# Altium footprint library WE-RJ45 LAN.PcbLib: 107 footprints (part 1 of 7) (continued)
## 7498011211 [mm] "LAN Transformer, body 21.65x15.88mm"
height 13.5
pads (14):
  rect 0.76x2.03 smd: 1(-5.715,11.615) 2(-4.445,11.615) 3(-3.175,11.615) 4(-1.905,11.615) 5(-0.635,11.615) 6(0.635,11.615) 7(1.905,11.615) 8(3.175,11.615) 9(4.445,11.615) 10(5.715,11.615)
  round 3.22 hole 3.22 unplated: MH1(-5.715,-0.065) MH2(5.715,-0.065)
  rect 3.3x3.3 smd: Shell(-9.145,-0.065) Shell(9.145,-0.065)
Top Overlay:
  lines w0.2: -9.209,-4.228 cw(c-10.32,-4.84) -9.053,-4.897 ccw(c-5.438,-5.337) -9.08,-5.367 ccw(c15.584,-6.195) -9.009,-8.239 ccw(c-0.59,-6.72) -8.04,-10.925 ; -8.04,-2.025 -8.04,-10.925 ; -8.04,1.875 -8.04,10.925 -6.39,10.925 ; 6.36,10.925 8.04,10.925 8.04,1.875 ; 8.04,-2.025 8.04,-10.925 ; 9.209,-4.228 ccw(c10.32,-4.84) 9.053,-4.897 cw(c5.438,-5.337) 9.08,-5.367 cw(c-15.584,-6.195) 9.009,-8.239 cw(c0.59,-6.72) 8.04,-10.925 ; -8.04,-10.925 8.04,-10.925
Top Designator:
  text ".Designator" at -7.498,-0.5 h1.5
Top Component Outline:
  lines w0.1: -9.209,-4.228 cw(c-10.32,-4.84) -9.053,-4.897 ccw(c-5.438,-5.337) -9.08,-5.367 ccw(c15.584,-6.195) -9.009,-8.239 ccw(c-0.59,-6.72) -8.04,-10.925 ; -8.04,-1.315 -10.25,-1.315 -10.25,1.185 -8.04,1.185 ; -5.945,10.925 -5.945,12.36 -5.485,12.36 -5.485,10.925 ; -4.675,10.925 -4.675,12.36 -4.215,12.36 -4.215,10.925 ; -3.405,10.925 -3.405,12.36 -2.945,12.36 -2.945,10.925 ; -2.135,10.925 -2.135,12.36 -1.675,12.36 -1.675,10.925 ; -0.865,10.925 -0.865,12.36 -0.405,12.36 -0.405,10.925 ; 0.405,10.925 0.405,12.36 0.865,12.36 0.865,10.925 ; 1.675,10.925 1.675,12.36 2.135,12.36 2.135,10.925 ; 2.945,10.925 2.945,12.36 3.405,12.36 3.405,10.925 ; 4.215,10.925 4.215,12.36 4.675,12.36 4.675,10.925 ; 5.485,10.925 5.485,12.36 5.945,12.36 5.945,10.925 ; 8.04,-1.315 10.25,-1.315 10.25,1.185 8.04,1.185 ; 9.209,-4.228 ccw(c10.32,-4.84) 9.053,-4.897 cw(c5.438,-5.337) 9.08,-5.367 cw(c-15.584,-6.195) 9.009,-8.239 cw(c0.59,-6.72) 8.04,-10.925 ; -8.04,-10.925 -8.04,10.925 8.04,10.925 8.04,-10.925 ; -8.04,-10.925 8.04,-10.925
Top 3D Body:
  lines w0.1: -9.209,-4.228 cw(c-10.32,-4.84) -9.053,-4.897 ccw(c-5.438,-5.337) -9.08,-5.367 ccw(c15.584,-6.195) -9.009,-8.239 ccw(c-0.59,-6.72) -8.04,-10.925 ; -8.04,-1.315 -10.25,-1.315 -10.25,1.185 -8.04,1.185 ; -5.945,10.925 -5.945,12.36 -5.485,12.36 -5.485,10.925 ; -4.675,10.925 -4.675,12.36 -4.215,12.36 -4.215,10.925 ; -3.405,10.925 -3.405,12.36 -2.945,12.36 -2.945,10.925 ; -2.135,10.925 -2.135,12.36 -1.675,12.36 -1.675,10.925 ; -0.865,10.925 -0.865,12.36 -0.405,12.36 -0.405,10.925 ; 0.405,10.925 0.405,12.36 0.865,12.36 0.865,10.925 ; 1.675,10.925 1.675,12.36 2.135,12.36 2.135,10.925 ; 2.945,10.925 2.945,12.36 3.405,12.36 3.405,10.925 ; 4.215,10.925 4.215,12.36 4.675,12.36 4.675,10.925 ; 5.485,10.925 5.485,12.36 5.945,12.36 5.945,10.925 ; 8.04,-1.315 10.25,-1.315 10.25,1.185 8.04,1.185 ; 9.209,-4.228 ccw(c10.32,-4.84) 9.053,-4.897 cw(c5.438,-5.337) 9.08,-5.367 cw(c-15.584,-6.195) 9.009,-8.239 cw(c0.59,-6.72) 8.04,-10.925 ; -8.04,-10.925 8.04,-10.925 ; -8.04,-10.925 -8.04,10.925 8.04,10.925 8.04,-10.925
Top Courtyard:
  lines w0.05: -0.5,0 0.5,0 ; 0,-0.5 0,0.5 ; -10.995,-11.125 10.995,-11.125 10.995,12.83 -10.995,12.83 -10.995,-11.125
3D body "7498011211.stp": height 14.82, standoff -2.7, extent -10.25,-10.79 10.25,12.36

## 7498111001A [mm] "LAN Transformer, body 21.6x15.88mm"
height 13.5
pads (14):
  rect 0.76x2.03 smd: 1(5.715,11.64) 2(4.445,11.64) 3(3.175,11.64) 4(1.905,11.64) 5(0.635,11.64) 6(-0.635,11.64) 7(-1.905,11.64) 8(-3.175,11.64) 9(-4.445,11.64) 10(-5.715,11.64)
  round 3.22 hole 3.22 unplated: MH1(-5.715,-0.04) MH2(5.715,-0.04)
  rect 3.3x3.18 smd: Shell(-9.145,-0.04) Shell(9.145,-0.04)
Top Overlay:
  lines w0.2: -9.209,-4.203 cw(c-10.32,-4.815) -9.053,-4.872 ccw(c-5.438,-5.312) -9.08,-5.342 ccw(c15.584,-6.17) -9.009,-8.214 ccw(c-0.59,-6.695) -8.04,-10.9 ; -8.04,-1.92 -8.04,-10.9 ; -8.04,1.84 -8.04,10.9 -6.39,10.9 ; 6.41,10.9 8.04,10.9 8.04,1.84 ; 8.04,-1.92 8.04,-10.9 ; 9.209,-4.203 ccw(c10.32,-4.815) 9.053,-4.872 cw(c5.438,-5.312) 9.08,-5.342 cw(c-15.584,-6.17) 9.009,-8.214 cw(c0.59,-6.695) 8.04,-10.9 ; -8.04,-10.9 8.04,-10.9
Top Designator:
  text ".Designator" at -7.498,-0.5 h1.5
Top Component Outline:
  lines w0.1: -9.209,-4.203 cw(c-10.32,-4.815) -9.053,-4.872 ccw(c-5.438,-5.312) -9.08,-5.342 ccw(c15.584,-6.17) -9.009,-8.214 ccw(c-0.59,-6.695) -8.04,-10.9 ; -8.04,-1.24 -10.25,-1.24 -10.25,1.16 -8.04,1.16 ; -5.935,10.9 -5.935,11.86 -5.495,11.86 -5.495,10.9 ; -4.665,10.9 -4.665,11.86 -4.225,11.86 -4.225,10.9 ; -3.395,10.9 -3.395,11.86 -2.955,11.86 -2.955,10.9 ; -2.125,10.9 -2.125,11.86 -1.685,11.86 -1.685,10.9 ; -0.855,10.9 -0.855,11.86 -0.415,11.86 -0.415,10.9 ; 0.415,10.9 0.415,11.86 0.855,11.86 0.855,10.9 ; 1.685,10.9 1.685,11.86 2.125,11.86 2.125,10.9 ; 2.955,10.9 2.955,11.86 3.395,11.86 3.395,10.9 ; 4.225,10.9 4.225,11.86 4.665,11.86 4.665,10.9 ; 5.495,10.9 5.495,11.86 5.935,11.86 5.935,10.9 ; 8.04,-1.24 10.25,-1.24 10.25,1.16 8.04,1.16 ; 9.209,-4.203 ccw(c10.32,-4.815) 9.053,-4.872 cw(c5.438,-5.312) 9.08,-5.342 cw(c-15.584,-6.17) 9.009,-8.214 cw(c0.59,-6.695) 8.04,-10.9 ; -8.04,-10.9 8.04,-10.9 ; -8.04,-10.9 -8.04,10.9 8.04,10.9 8.04,-10.9
Top 3D Body:
  lines w0.1: -9.209,-4.203 cw(c-10.32,-4.815) -9.053,-4.872 ccw(c-5.438,-5.312) -9.08,-5.342 ccw(c15.584,-6.17) -9.009,-8.214 ccw(c-0.59,-6.695) -8.04,-10.9 ; -8.04,-1.24 -10.25,-1.24 -10.25,1.16 -8.04,1.16 ; -5.935,10.9 -5.935,11.86 -5.495,11.86 -5.495,10.9 ; -4.665,10.9 -4.665,11.86 -4.225,11.86 -4.225,10.9 ; -3.395,10.9 -3.395,11.86 -2.955,11.86 -2.955,10.9 ; -2.125,10.9 -2.125,11.86 -1.685,11.86 -1.685,10.9 ; -0.855,10.9 -0.855,11.86 -0.415,11.86 -0.415,10.9 ; 0.415,10.9 0.415,11.86 0.855,11.86 0.855,10.9 ; 1.685,10.9 1.685,11.86 2.125,11.86 2.125,10.9 ; 2.955,10.9 2.955,11.86 3.395,11.86 3.395,10.9 ; 4.225,10.9 4.225,11.86 4.665,11.86 4.665,10.9 ; 5.495,10.9 5.495,11.86 5.935,11.86 5.935,10.9 ; 8.04,-1.24 10.25,-1.24 10.25,1.16 8.04,1.16 ; 9.209,-4.203 ccw(c10.32,-4.815) 9.053,-4.872 cw(c5.438,-5.312) 9.08,-5.342 cw(c-15.584,-6.17) 9.009,-8.214 cw(c0.59,-6.695) 8.04,-10.9 ; -8.04,-10.9 -8.04,10.9 8.04,10.9 8.04,-10.9 ; -8.04,-10.9 8.04,-10.9
Top Courtyard:
  lines w0.05: -0.5,0 0.5,0 ; 0,-0.5 0,0.5 ; -10.995,-11.1 -10.995,12.855 10.995,12.855 10.995,-11.1 -10.995,-11.1
3D body "7498111001.stp": height 13.6, standoff -2.62, extent -10.25,-10.74 10.25,11.86

## 7498111120AR [mm] "LAN Transformer, body 21.84x15.65mm"
height 8.89
pads (18):
  rect 0.71x2.29 smd: 1(6.63,10.14) 2(5.61,10.14) 3(4.59,10.14) 4(3.57,10.14) 5(2.55,10.14) 6(1.53,10.14) 7(0.51,10.14) 8(-0.51,10.14) 9(-1.53,10.14) 10(-2.55,10.14) 11(-3.57,10.14) 12(-4.59,10.14) 13(-5.61,10.14) 14(-6.63,10.14)
  round 1.4 hole 1.4 unplated: MH1(-3.5,6.96) MH2(3.5,6.96)
  rect 1.4x2.54 smd: Shell(-8.51,-3.24) Shell(8.51,-3.24)
Top Overlay:
  lines w0.2: -8.93,-4.858 ccw(c-7.19,-4.955) -8.926,-5.104 ccw(c-7.186,-5.201) -8.922,-5.351 ccw(c-7.183,-5.447) -8.919,-5.597 ccw(c-7.179,-5.694) -8.915,-5.843 ccw(c-7.175,-5.94) -8.911,-6.09 ccw(c-1.375,-5.89) -8.847,-6.888 ccw(c-3.725,-6.44) -7.933,-9.395 ; -7.925,-4.84 -7.925,-11.34 7.925,-11.34 7.925,-4.84 ; -7.925,-1.64 -7.925,10.7 -7.315,10.7 ; 7.315,10.7 7.925,10.7 7.925,-1.64 ; 7.933,-9.395 ccw(c3.725,-6.44) 8.847,-6.888 ccw(c1.375,-5.89) 8.911,-6.09 ccw(c7.175,-5.94) 8.915,-5.843 ccw(c7.179,-5.694) 8.919,-5.597 ccw(c7.183,-5.447) 8.922,-5.351 ccw(c7.186,-5.201) 8.926,-5.104 ccw(c7.19,-4.955) 8.93,-4.858
Keep-Out Layer:
  board cut-out: -7.81,-11.24 -7.81,2.73 7.81,2.73 7.81,-11.24
Top Designator:
  text ".Designator" at -7.498,-0.5 h1.5
Mechanical 8:
  lines w0.1: -7.81,-11.24 7.81,-11.24 7.81,2.73 -7.81,2.73 -7.81,-11.24
  text "PCB Cutout Area" at -7.2,-4.13 h1.02
Top Component Outline:
  lines w0.1: -8.93,-4.858 ccw(c-7.19,-4.955) -8.926,-5.104 ccw(c-7.186,-5.201) -8.922,-5.351 ccw(c-7.183,-5.447) -8.919,-5.597 ccw(c-7.179,-5.694) -8.915,-5.843 ccw(c-7.175,-5.94) -8.911,-6.09 ccw(c-1.375,-5.89) -8.847,-6.888 ccw(c-3.725,-6.44) -7.933,-9.395 ; -6.83,10.7 -6.83,11.24 -6.43,11.24 -6.43,10.7 ; -5.81,10.7 -5.81,11.24 -5.41,11.24 -5.41,10.7 ; -4.79,10.7 -4.79,11.24 -4.39,11.24 -4.39,10.7 ; -3.77,10.7 -3.77,11.24 -3.37,11.24 -3.37,10.7 ; -2.75,10.7 -2.75,11.24 -2.35,11.24 -2.35,10.7 ; -1.73,10.7 -1.73,11.24 -1.33,11.24 -1.33,10.7 ; -0.71,10.7 -0.71,11.24 -0.31,11.24 -0.31,10.7 ; 0.31,10.7 0.31,11.24 0.71,11.24 0.71,10.7 ; 1.33,10.7 1.33,11.24 1.73,11.24 1.73,10.7 ; 2.35,10.7 2.35,11.24 2.75,11.24 2.75,10.7 ; 3.37,10.7 3.37,11.24 3.77,11.24 3.77,10.7 ; 4.39,10.7 4.39,11.24 4.79,11.24 4.79,10.7 ; 5.41,10.7 5.41,11.24 5.81,11.24 5.81,10.7 ; 6.43,10.7 6.43,11.24 6.83,11.24 6.83,10.7 ; 7.933,-9.395 ccw(c3.725,-6.44) 8.847,-6.888 ccw(c1.375,-5.89) 8.911,-6.09 ccw(c7.175,-5.94) 8.915,-5.843 ccw(c7.179,-5.694) 8.919,-5.597 ccw(c7.183,-5.447) 8.922,-5.351 ccw(c7.186,-5.201) 8.926,-5.104 ccw(c7.19,-4.955) 8.93,-4.858 ; -9.075,-4.29 -7.925,-4.29 -9.075,-4.29 ; -9.075,-4.29 -9.075,-2.19 ; -9.075,-4.29 -9.075,-2.19 ; -9.075,-2.19 -7.925,-2.19 -9.075,-2.19 ; 9.075,-4.29 9.075,-2.19 ; 9.075,-4.29 7.925,-4.29 9.075,-4.29 ; 9.075,-4.29 9.075,-2.19 ; 9.075,-2.19 7.925,-2.19 9.075,-2.19 ; -7.925,-11.34 -7.925,10.7 7.925,10.7 7.925,-11.34 -7.925,-11.34
Top 3D Body:
  lines w0.1: -8.93,-4.858 ccw(c-7.19,-4.955) -8.926,-5.104 ccw(c-7.186,-5.201) -8.922,-5.351 ccw(c-7.183,-5.447) -8.919,-5.597 ccw(c-7.179,-5.694) -8.915,-5.843 ccw(c-7.175,-5.94) -8.911,-6.09 ccw(c-1.375,-5.89) -8.847,-6.888 ccw(c-3.725,-6.44) -7.933,-9.395 ; -6.83,10.7 -6.83,11.24 -6.43,11.24 -6.43,10.7 ; -5.81,10.7 -5.81,11.24 -5.41,11.24 -5.41,10.7 ; -4.79,10.7 -4.79,11.24 -4.39,11.24 -4.39,10.7 ; -3.77,10.7 -3.77,11.24 -3.37,11.24 -3.37,10.7 ; -2.75,10.7 -2.75,11.24 -2.35,11.24 -2.35,10.7 ; -1.73,10.7 -1.73,11.24 -1.33,11.24 -1.33,10.7 ; -0.71,10.7 -0.71,11.24 -0.31,11.24 -0.31,10.7 ; 0.31,10.7 0.31,11.24 0.71,11.24 0.71,10.7 ; 1.33,10.7 1.33,11.24 1.73,11.24 1.73,10.7 ; 2.35,10.7 2.35,11.24 2.75,11.24 2.75,10.7 ; 3.37,10.7 3.37,11.24 3.77,11.24 3.77,10.7 ; 4.39,10.7 4.39,11.24 4.79,11.24 4.79,10.7 ; 5.41,10.7 5.41,11.24 5.81,11.24 5.81,10.7 ; 6.43,10.7 6.43,11.24 6.83,11.24 6.83,10.7 ; 7.933,-9.395 ccw(c3.725,-6.44) 8.847,-6.888 ccw(c1.375,-5.89) 8.911,-6.09 ccw(c7.175,-5.94) 8.915,-5.843 ccw(c7.179,-5.694) 8.919,-5.597 ccw(c7.183,-5.447) 8.922,-5.351 ccw(c7.186,-5.201) 8.926,-5.104 ccw(c7.19,-4.955) 8.93,-4.858 ; -9.075,-4.29 -9.075,-2.19 ; -9.075,-4.29 -7.925,-4.29 -9.075,-4.29 ; -9.075,-4.29 -9.075,-2.19 ; -9.075,-2.19 -7.925,-2.19 -9.075,-2.19 ; 9.075,-4.29 7.925,-4.29 9.075,-4.29 ; 9.075,-4.29 9.075,-2.19 ; 9.075,-4.29 9.075,-2.19 ; 9.075,-2.19 7.925,-2.19 9.075,-2.19 ; -7.925,-11.34 7.925,-11.34 7.925,10.7 -7.925,10.7 -7.925,-11.34
Top Courtyard:
  lines w0.05: -9.41,-11.54 9.41,-11.54 ; -9.41,-11.485 -9.41,11.485 9.41,11.485 9.41,-11.485 ; -0.5,0 0.5,0 ; 0,-0.5 0,0.5
3D body "7498111120AR.stp": height 10.1, standoff -3.2, extent -9.075,-11.24 9.075,11.24

## 7498111123 [mm] "Integrated RJ45 Transformer, THR, body 15.9x21.25mm"
height 13.5
pads (18):
  round 1.4 hole 0.9: 1(-5.715,8.89) 2(-4.445,6.35) 3(-3.175,8.89) 4(-1.905,6.35) 5(-0.635,8.89) 6(0.635,6.35) 7(1.905,8.89) 8(3.175,6.35) 9(4.445,8.89) 10(5.715,6.35)
  round 1.8 hole 1.2: 11(-6.64,-4.06) 12(-4.1,-4.06) 13(4.1,-4.06) 14(6.64,-4.06)
  round 3.25 hole 3.25 unplated: MH1(-5.715,0) MH2(5.715,0)
  round 2.4 hole 1.6: Shell(-7.85,3.05) Shell(7.85,3.05)
Top Overlay:
  lines w0.2: -8.171,-2.975 ccw(c-5.3,-6.375) -7.95,-9.95 ; -7.95,1.54 -7.95,-10.75 7.95,-10.75 7.95,1.54 ; -7.95,4.84 -7.95,10.5 -6.955,10.5 ; 5.695,10.5 7.95,10.5 7.95,4.84 ; 7.95,-9.95 ccw(c5.3,-6.375) 8.171,-2.975
Top Paste:
  rectangle: 4.895,1.8 10.595,4.6
  region: -4.895,4.6 -10.595,4.6 -10.595,1.8 -4.895,1.8
  rectangle: -6.715,7.89 -4.715,10.49
  rectangle: -4.175,7.89 -2.175,10.49
  rectangle: -1.635,7.89 0.365,10.49
  rectangle: 0.905,7.89 2.905,10.49
  rectangle: 3.445,7.89 5.445,10.49
  rectangle: -5.445,4.95 -3.445,7.55
  rectangle: -2.905,4.95 -0.905,7.55
  rectangle: -0.365,4.95 1.635,7.55
  rectangle: 2.175,4.95 4.175,7.55
  rectangle: 4.715,4.95 6.715,7.55
  rectangle: 3.095,-5.66 5.095,-2.46
  rectangle: 5.635,-5.66 7.635,-2.46
  region: -5.625,-2.46 -7.625,-2.46 -7.625,-5.66 -5.625,-5.66
  region: -3.085,-2.46 -5.085,-2.46 -5.085,-5.66 -3.085,-5.66
Top Designator:
  text ".Designator" at -7.498,-0.5 h1.5
Top Component Outline:
  lines w0.1: -8.171,-2.975 ccw(c-5.3,-6.375) -7.95,-9.95 ; 7.95,-9.95 ccw(c5.3,-6.375) 8.171,-2.975 ; -7.95,-10.75 7.95,-10.75 7.95,10.5 -7.95,10.5 -7.95,-10.75
Top Courtyard:
  lines w0.05: -0.5,0 0.5,0 ; 0,-0.5 0,0.5 ; -10.795,-10.95 -10.795,10.7 10.795,10.7 10.795,-10.95 -10.795,-10.95
3D body "7498111123.stp": height 16.29, standoff -2.33, extent -9.718,-10.75 9.718,10.6

## 7498111124 [mm] "Integrated RJ45 Transformer, THR, body 15.9x21.25mm"
height 13.5
pads (18):
  round 1.4 hole 0.9: 1(-5.715,8.89) 2(-4.445,6.35) 3(-3.175,8.89) 4(-1.905,6.35) 5(-0.635,8.89) 6(0.635,6.35) 7(1.905,8.89) 8(3.175,6.35) 9(4.445,8.89) 10(5.715,6.35)
  round 1.52 hole 1.02: 11(-6.64,-4.06) 12(-4.09,-4.06) 13(4.09,-4.06) 14(6.64,-4.06)
  round 3.25 hole 3.25 unplated: MH1(-5.715,0) MH2(5.715,0)
  round 2.4 hole 1.6: Shell(-7.85,3.05) Shell(7.85,3.05)
Top Overlay:
  lines w0.2: -8.171,-2.975 ccw(c-5.3,-6.375) -7.95,-9.95 ; -7.95,1.5 -7.95,-10.75 7.95,-10.75 7.95,1.5 ; -7.95,4.85 -7.95,10.5 -6.95,10.5 ; 5.7,10.5 7.95,10.5 7.95,4.85 ; 7.95,-9.95 ccw(c5.3,-6.375) 8.171,-2.975
Top Paste:
  rectangle: 3.085,-5.66 5.085,-2.46
  rectangle: 5.625,-5.66 7.625,-2.46
  rectangle: -5.085,-5.66 -3.085,-2.46
  rectangle: -7.625,-5.66 -5.625,-2.46
  rectangle: 4.895,1.8 10.595,4.6
  region: -4.895,4.6 -10.595,4.6 -10.595,1.8 -4.895,1.8
  rectangle: -6.715,7.89 -4.715,10.49
  rectangle: -4.175,7.89 -2.175,10.49
  rectangle: -1.635,7.89 0.365,10.49
  rectangle: 0.905,7.89 2.905,10.49
  rectangle: 3.445,7.89 5.445,10.49
  rectangle: -5.445,4.95 -3.445,7.55
  rectangle: -2.905,4.95 -0.905,7.55
  rectangle: -0.365,4.95 1.635,7.55
  rectangle: 2.175,4.95 4.175,7.55
  rectangle: 4.715,4.95 6.715,7.55
Top Designator:
  text ".Designator" at -7.498,-0.5 h1.5
Top Component Outline:
  lines w0.1: -8.171,-2.975 ccw(c-5.3,-6.375) -7.95,-9.95 ; 7.95,-9.95 ccw(c5.3,-6.375) 8.171,-2.975 ; -7.95,-10.75 7.95,-10.75 7.95,10.5 -7.95,10.5 -7.95,-10.75
Top Courtyard:
  lines w0.05: -0.5,0 0.5,0 ; 0,-0.5 0,0.5 ; -10.795,-10.95 10.795,-10.95 10.795,10.7 -10.795,10.7 -10.795,-10.95
3D body "7498111124.stp": height 16.34, standoff -2.28, extent -9.718,-10.75 9.718,10.6

## 7498210002 [mm] "LAN Transformer, body 21.25x16mm"
height 13.6
pads (12):
  rect 0.76x4.18 smd: 1(-5.715,11.61) 2(-4.445,11.61) 3(-3.175,11.61) 4(-1.905,11.61) 5(-0.635,11.61) 6(0.635,11.61) 9(4.445,11.61) 10(5.715,11.61)
  round 3.3 hole 3.3 unplated: MH1(-5.715,0) MH2(5.715,0)
  rect 3.42x4.58 smd: Shell(-9.94,-3.97) Shell(9.94,-3.97)
Top Overlay:
  lines w0.2: -8.1,-6.6 -8.1,-11 8.1,-11 8.1,-6.6 ; -8.1,-1.3 -8.1,10.45 -6.4,10.45 ; 1.35,10.45 3.75,10.45 ; 6.4,10.45 8.1,10.45 8.1,-1.3
Top Designator:
  text ".Designator" at -7.498,-0.5 h1.5
Top Component Outline:
  lines w0.1: -8.1,-5.97 -10.5,-5.97 -10.5,-1.97 -8.1,-1.97 ; -5.92,10.45 -5.92,13.43 -5.51,13.43 -5.51,10.45 ; -4.65,10.45 -4.65,13.43 -4.24,13.43 -4.24,10.45 ; -3.38,10.45 -3.38,13.43 -2.97,13.43 -2.97,10.45 ; -2.11,10.45 -2.11,13.43 -1.7,13.43 -1.7,10.45 ; -0.84,10.45 -0.84,13.43 -0.43,13.43 -0.43,10.45 ; 0.43,10.45 0.43,13.43 0.84,13.43 0.84,10.45 ; 4.24,10.45 4.24,13.43 4.65,13.43 4.65,10.45 ; 5.51,10.45 5.51,13.43 5.92,13.43 5.92,10.45 ; 8.1,-5.97 10.5,-5.97 10.5,-1.97 8.1,-1.97 ; -8.1,-11 8.1,-11 8.1,10.45 -8.1,10.45 -8.1,-11
Top 3D Body:
  lines w0.1: -8.1,-5.97 -10.5,-5.97 -10.5,-1.97 -8.1,-1.97 ; -5.92,10.45 -5.92,13.43 -5.51,13.43 -5.51,10.45 ; -4.65,10.45 -4.65,13.43 -4.24,13.43 -4.24,10.45 ; -3.38,10.45 -3.38,13.43 -2.97,13.43 -2.97,10.45 ; -2.11,10.45 -2.11,13.43 -1.7,13.43 -1.7,10.45 ; -0.84,10.45 -0.84,13.43 -0.43,13.43 -0.43,10.45 ; 0.43,10.45 0.43,13.43 0.84,13.43 0.84,10.45 ; 4.24,10.45 4.24,13.43 4.65,13.43 4.65,10.45 ; 5.51,10.45 5.51,13.43 5.92,13.43 5.92,10.45 ; 8.1,-5.97 10.5,-5.97 10.5,-1.97 8.1,-1.97 ; -8.1,-11 -8.1,10.45 8.1,10.45 8.1,-11 -8.1,-11
Top Courtyard:
  lines w0.05: -0.5,0 0.5,0 ; 0,-0.5 0,0.5 ; -11.85,-11.2 11.85,-11.2 11.85,13.9 -11.85,13.9 -11.85,-11.2
3D body "7498210002.stp": height 13.62, standoff -0.98, extent -10.5,-10.9 10.5,13.43

## 7498210003 [mm] "LAN Transformer, body 22.48x15.65mm"
height 11.3
pads (14):
  rect 0.71x3 smd: 1(5.61,10.78) 2(4.59,10.78) 3(3.57,10.78) 4(2.55,10.78) 5(1.53,10.78) 6(0.51,10.78) 9(-2.55,10.78) 10(-3.57,10.78) 11(-4.59,10.78) 12(-5.61,10.78)
  round 1.4 hole 1.4 unplated: MH1(-3.5,7.28) MH2(3.5,7.28)
  rect 1.4x3 smd: Shell(-8.725,-2.92) Shell(8.725,-2.92)
Top Overlay:
  lines w0.2: -8.829,-4.75 ccw(c-7.086,-4.781) -8.822,-4.931 ccw(c-7.083,-5.027) -8.819,-5.177 ccw(c-7.079,-5.274) -8.815,-5.423 ccw(c-7.075,-5.52) -8.811,-5.67 ccw(c-1.275,-5.47) -8.747,-6.468 ccw(c-3.625,-6.02) -7.833,-8.975 ; -7.825,-4.7 -7.825,-10.92 7.825,-10.92 7.825,-4.7 ; -7.825,-1.15 -7.825,10.92 -6.275,10.92 ; 6.275,10.92 7.825,10.92 7.825,-1.15 ; 7.833,-8.975 ccw(c3.625,-6.02) 8.747,-6.468 ccw(c1.275,-5.47) 8.811,-5.67 ccw(c7.075,-5.52) 8.815,-5.423 ccw(c7.079,-5.274) 8.819,-5.177 ccw(c7.083,-5.027) 8.822,-4.931 ccw(c7.086,-4.781) 8.829,-4.75
Keep-Out Layer:
  board cut-out: 6.825,3.08 6.923,3.08 7.117,3.042 7.299,2.966 7.462,2.857 7.602,2.717 7.711,2.554 7.787,2.372 7.825,2.178 7.825,2.08 7.825,-8.42 -7.825,-8.42 -7.825,2.08 -7.825,2.178 -7.787,2.372 -7.711,2.554 -7.602,2.717 -7.462,2.857 -7.299,2.966 -7.117,3.042 -6.923,3.08 -6.825,3.08
Top Designator:
  text ".Designator" at -7.498,-0.5 h1.5
Mechanical 8:
  lines w0.1: -7.825,-8.42 7.825,-8.42 7.825,2.08 ccw(c6.825,2.08) 6.825,3.08 -6.825,3.08 ccw(c-6.825,2.08) -7.825,2.08 -7.825,-8.42
  text "PCB Cutout Area" at -7.07,-4.6 h1.02
Top Component Outline:
  lines w0.1: -8.826,-4.684 ccw(c-7.086,-4.781) -8.822,-4.931 ccw(c-7.083,-5.027) -8.819,-5.177 ccw(c-7.079,-5.274) -8.815,-5.423 ccw(c-7.075,-5.52) -8.811,-5.67 ccw(c-1.275,-5.47) -8.747,-6.468 ccw(c-3.625,-6.02) -7.833,-8.975 ; -7.825,-3.97 -9.075,-3.97 -9.075,-1.87 -7.825,-1.87 ; -5.82,10.92 -5.82,11.56 -5.4,11.56 -5.4,10.92 ; -4.8,10.92 -4.8,11.56 -4.38,11.56 -4.38,10.92 ; -3.78,10.92 -3.78,11.56 -3.36,11.56 -3.36,10.92 ; -2.76,10.92 -2.76,11.56 -2.34,11.56 -2.34,10.92 ; 0.3,10.92 0.3,11.56 0.72,11.56 0.72,10.92 ; 1.32,10.92 1.32,11.56 1.74,11.56 1.74,10.92 ; 2.34,10.92 2.34,11.56 2.76,11.56 2.76,10.92 ; 3.36,10.92 3.36,11.56 3.78,11.56 3.78,10.92 ; 4.38,10.92 4.38,11.56 4.8,11.56 4.8,10.92 ; 5.4,10.92 5.4,11.56 5.82,11.56 5.82,10.92 ; 7.825,-3.97 9.075,-3.97 9.075,-1.87 7.825,-1.87 ; 7.833,-8.975 ccw(c3.625,-6.02) 8.747,-6.468 ccw(c1.275,-5.47) 8.811,-5.67 ccw(c7.075,-5.52) 8.815,-5.423 ccw(c7.079,-5.274) 8.819,-5.177 ccw(c7.083,-5.027) 8.822,-4.931 ccw(c7.086,-4.781) 8.826,-4.684 ; -7.825,-10.92 7.825,-10.92 7.825,10.92 -7.825,10.92 -7.825,-10.92
Top 3D Body:
  lines w0.1: -8.826,-4.684 ccw(c-7.086,-4.781) -8.822,-4.931 ccw(c-7.083,-5.027) -8.819,-5.177 ccw(c-7.079,-5.274) -8.815,-5.423 ccw(c-7.075,-5.52) -8.811,-5.67 ccw(c-1.275,-5.47) -8.747,-6.468 ccw(c-3.625,-6.02) -7.833,-8.975 ; -7.825,-3.97 -9.075,-3.97 -9.075,-1.87 -7.825,-1.87 ; -5.82,10.92 -5.82,11.56 -5.4,11.56 -5.4,10.92 ; -4.8,10.92 -4.8,11.56 -4.38,11.56 -4.38,10.92 ; -3.78,10.92 -3.78,11.56 -3.36,11.56 -3.36,10.92 ; -2.76,10.92 -2.76,11.56 -2.34,11.56 -2.34,10.92 ; 0.3,10.92 0.3,11.56 0.72,11.56 0.72,10.92 ; 1.32,10.92 1.32,11.56 1.74,11.56 1.74,10.92 ; 2.34,10.92 2.34,11.56 2.76,11.56 2.76,10.92 ; 3.36,10.92 3.36,11.56 3.78,11.56 3.78,10.92 ; 4.38,10.92 4.38,11.56 4.8,11.56 4.8,10.92 ; 5.4,10.92 5.4,11.56 5.82,11.56 5.82,10.92 ; 7.825,-3.97 9.075,-3.97 9.075,-1.87 7.825,-1.87 ; 7.833,-8.975 ccw(c3.625,-6.02) 8.747,-6.468 ccw(c1.275,-5.47) 8.811,-5.67 ccw(c7.075,-5.52) 8.815,-5.423 ccw(c7.079,-5.274) 8.819,-5.177 ccw(c7.083,-5.027) 8.822,-4.931 ccw(c7.086,-4.781) 8.826,-4.684 ; -7.825,-10.92 -7.825,10.92 7.825,10.92 7.825,-10.92 -7.825,-10.92
Top Courtyard:
  lines w0.05: -0.5,0 0.5,0 ; 0,-0.5 0,0.5 ; -9.625,-11.12 -9.625,12.48 9.625,12.48 9.625,-11.12 -9.625,-11.12
3D body "7498210003.stp": height 10.1, standoff -3.2, extent -9.075,-10.92 9.075,11.56

## 7498210220A [mm] "LAN Transformer, body 21.84x15.65mm"
height 8.89
pads (17):
  rect 0.71x3 smd: 1(6.63,10.78) 2(5.61,10.78) 3(4.59,10.78) 4(3.57,10.78) 5(2.55,10.78) 6(1.53,10.78) 7(0.51,10.78) 9(-1.53,10.78) 10(-2.55,10.78) 11(-3.57,10.78) 12(-4.59,10.78) 13(-5.61,10.78) 14(-6.63,10.78)
  round 1.4 hole 1.4 unplated: MH1(-3.5,7.28) MH2(3.5,7.28)
  rect 1.8x3 smd: Shell(-8.71,-2.92) Shell(8.71,-2.92)
Top Overlay:
  lines w0.2: -7.825,-4.72 -7.825,-10.92 7.825,-10.92 7.825,-4.72 ; -7.825,-1.12 -7.825,10.92 -7.275,10.92 ; 7.275,10.92 7.825,10.92 7.825,-1.12
Keep-Out Layer:
  board cut-out: -7.81,-10.92 7.81,-10.92 7.81,1.29 7.81,1.389 7.772,1.582 7.696,1.764 7.587,1.928 7.447,2.067 7.284,2.176 7.102,2.252 6.908,2.29 6.81,2.29 -6.81,2.29 -6.908,2.29 -7.102,2.252 -7.284,2.176 -7.447,2.067 -7.587,1.928 -7.696,1.764 -7.772,1.582 -7.81,1.389 -7.81,1.29
Top Designator:
  text ".Designator" at -7.498,-0.5 h1.5
Mechanical 8:
  lines w0.1: -7.81,-10.92 -7.81,1.29 cw(c-6.81,1.29) -6.81,2.29 6.81,2.29 cw(c6.81,1.29) 7.81,1.29 7.81,-10.92 -7.81,-10.92
  text "PCB Cutout Area" at -7.2,-4.48 h1.02
Top Component Outline:
  lines w0.1: -7.825,-3.67 -8.775,-3.67 -8.775,-2.17 -7.825,-2.17 ; -6.79,10.92 -6.79,11.555 -6.47,11.555 -6.47,10.92 ; -5.77,10.92 -5.77,11.555 -5.45,11.555 -5.45,10.92 ; -4.75,10.92 -4.75,11.555 -4.43,11.555 -4.43,10.92 ; -3.73,10.92 -3.73,11.555 -3.41,11.555 -3.41,10.92 ; -2.71,10.92 -2.71,11.555 -2.39,11.555 -2.39,10.92 ; -1.69,10.92 -1.69,11.555 -1.37,11.555 -1.37,10.92 ; 0.35,10.92 0.35,11.555 0.67,11.555 0.67,10.92 ; 1.37,10.92 1.37,11.555 1.69,11.555 1.69,10.92 ; 2.39,10.92 2.39,11.555 2.71,11.555 2.71,10.92 ; 3.41,10.92 3.41,11.555 3.73,11.555 3.73,10.92 ; 4.43,10.92 4.43,11.555 4.75,11.555 4.75,10.92 ; 5.45,10.92 5.45,11.555 5.77,11.555 5.77,10.92 ; 6.47,10.92 6.47,11.555 6.79,11.555 6.79,10.92 ; 7.825,-3.67 8.775,-3.67 8.775,-2.17 7.825,-2.17 ; -7.825,-10.92 -7.825,10.92 7.825,10.92 7.825,-10.92 -7.825,-10.92
Top 3D Body:
  lines w0.1: -7.825,-3.67 -8.775,-3.67 -8.775,-2.17 -7.825,-2.17 ; -6.79,10.92 -6.79,11.555 -6.47,11.555 -6.47,10.92 ; -5.77,10.92 -5.77,11.555 -5.45,11.555 -5.45,10.92 ; -4.75,10.92 -4.75,11.555 -4.43,11.555 -4.43,10.92 ; -3.73,10.92 -3.73,11.555 -3.41,11.555 -3.41,10.92 ; -2.71,10.92 -2.71,11.555 -2.39,11.555 -2.39,10.92 ; -1.69,10.92 -1.69,11.555 -1.37,11.555 -1.37,10.92 ; 0.35,10.92 0.35,11.555 0.67,11.555 0.67,10.92 ; 1.37,10.92 1.37,11.555 1.69,11.555 1.69,10.92 ; 2.39,10.92 2.39,11.555 2.71,11.555 2.71,10.92 ; 3.41,10.92 3.41,11.555 3.73,11.555 3.73,10.92 ; 4.43,10.92 4.43,11.555 4.75,11.555 4.75,10.92 ; 5.45,10.92 5.45,11.555 5.77,11.555 5.77,10.92 ; 6.47,10.92 6.47,11.555 6.79,11.555 6.79,10.92 ; 7.825,-3.67 8.775,-3.67 8.775,-2.17 7.825,-2.17 ; -7.825,-10.92 7.825,-10.92 7.825,10.92 -7.825,10.92 -7.825,-10.92
Top Courtyard:
  lines w0.05: -0.5,0 0.5,0 ; 0,-0.5 0,0.5 ; -9.81,-11.12 9.81,-11.12 9.81,12.48 -9.81,12.48 -9.81,-11.12
3D body "7498210220A.stp": height 8.9, standoff -2.4, extent -8.775,-10.92 8.775,11.555

## 7499010001A [mm] "LAN Transformer, body 25.3x16.2mm"
height 13.5
pads (12):
  rrect50% 1.4x1.4 hole 0.9: 1(4.445,7.04)
  round 1.4 hole 0.9: 2(3.175,4.5) 3(1.905,7.04) 4(0.635,4.5) 5(-0.635,7.04) 6(-1.905,4.5) 7(-3.175,7.04) 8(-4.445,4.5)
  round 3.25 hole 3.25 unplated: MH1(-5.715,-1.85) MH2(5.715,-1.85)
  round 2.4 hole 1.6: Shell(-7.9,1.2) Shell(7.9,1.2)
Top Overlay:
  lines w0.2: -8.1,-0.3 -8.1,-12.65 8.1,-12.65 8.1,-0.3 ; -8.1,2.7 -8.1,12.65 8.1,12.65 8.1,2.7
Top Designator:
  text ".Designator" at -7.498,-0.5 h1.5
Top Component Outline:
  lines w0.1: -8.1,-12.65 -8.1,12.65 8.1,12.65 8.1,-12.65 -8.1,-12.65
Top 3D Body:
  lines w0.1: -8.1,-12.65 8.1,-12.65 8.1,12.65 -8.1,12.65 -8.1,-12.65
Top Courtyard:
  lines w0.05: -0.5,0 0.5,0 ; 0,-0.5 0,0.5 ; -9.3,-12.85 -9.3,12.85 9.3,12.85 9.3,-12.85 -9.3,-12.85
3D body "7499010001A.stp": height 13.75, standoff -3.3, extent -8.2,-12.65 8.2,12.65